# Altium footprint library Lib_001.PcbLib: 429 footprints (part 18 of 28)
Each footprint in its own frame and in the unit in brackets; x right, y up, seen from the top. Pads: shape width x height; smd on the part's side, far side on the other; paste and mask are expansions set on the pad; w line width, h text height; cw(c..) or ccw(c..) is an arc to the next point about the centre after c.
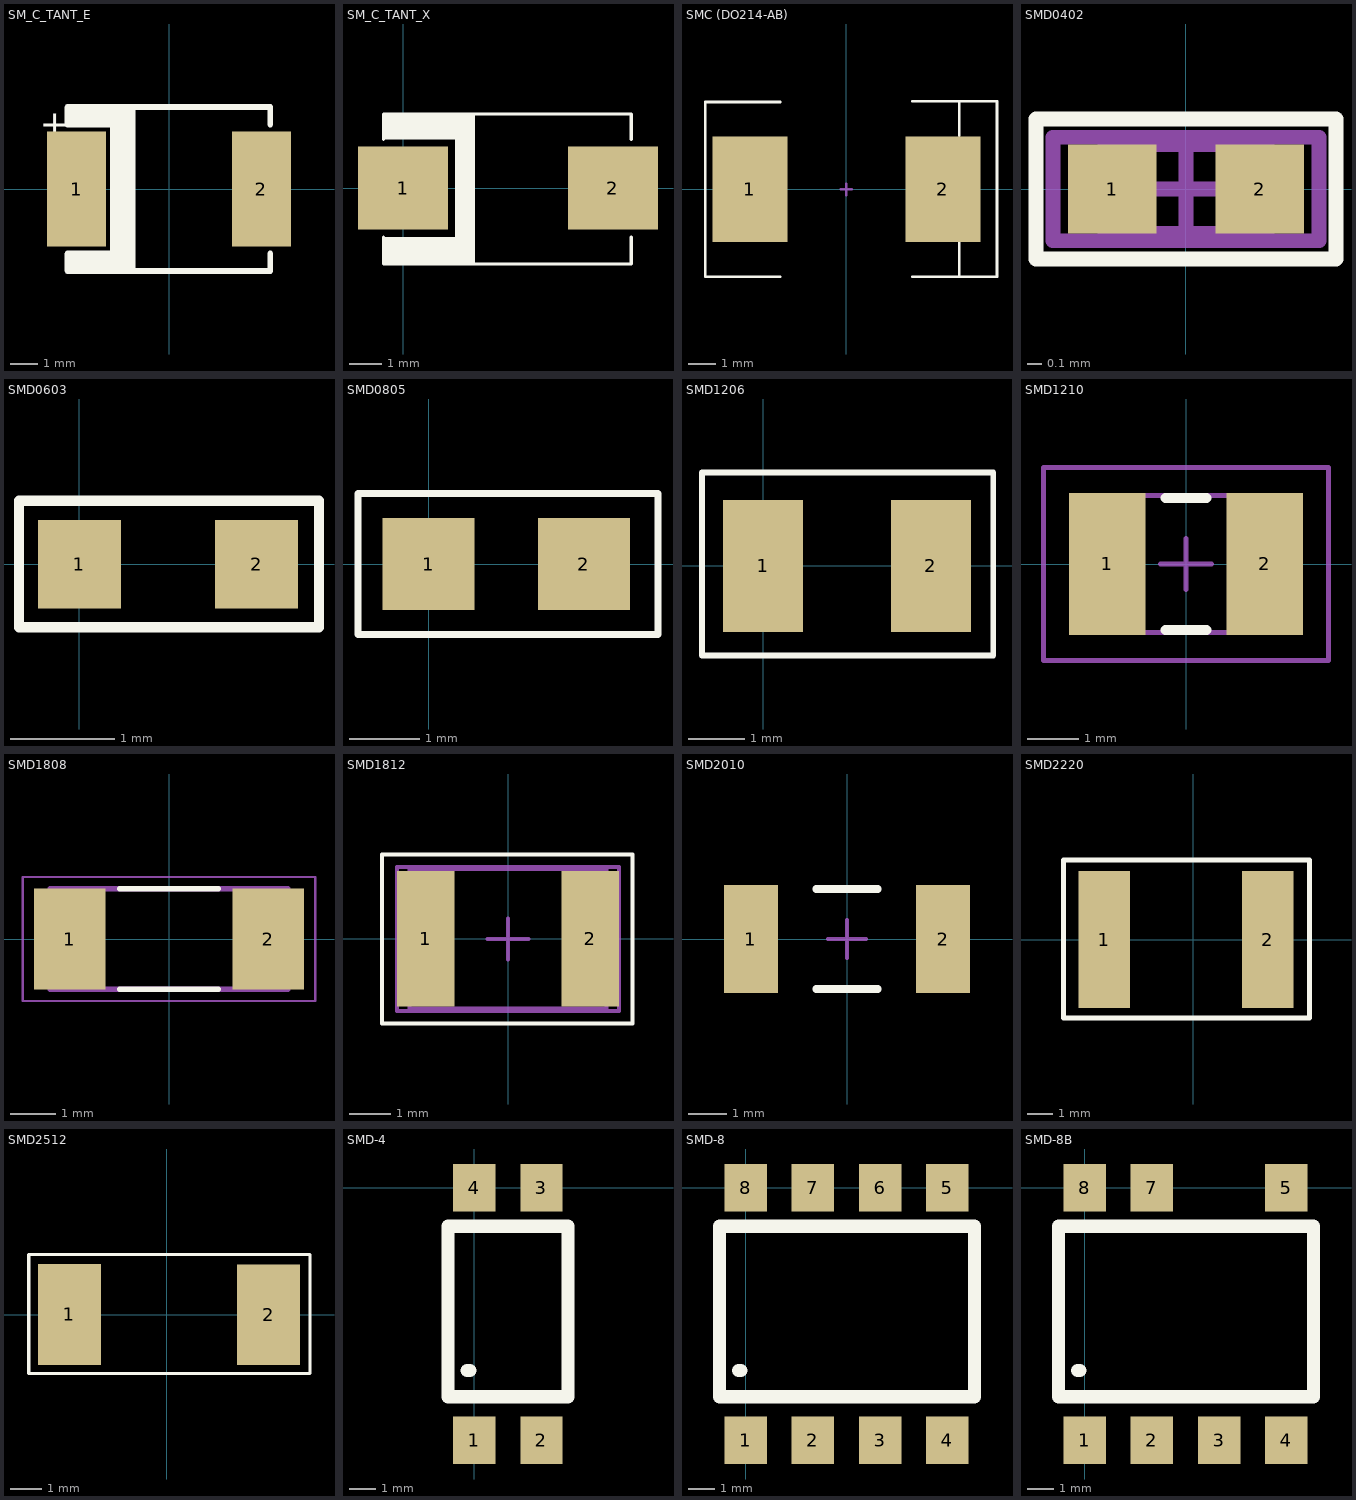
[diagram p17: the footprints below, top view; thin cyan lines are the x and y axes]

## SM_C_TANT_E [mil]
pads (2):
  rect 85x165 smd: 1(-132.5,0) 2(132.5,0)
Top Overlay:
  region: -49.44,120.56 -48.17,117.5 -48.17,-117.5 -49.44,-120.56 -52.5,-121.83 -145,-121.83 -148.06,-120.56 -149.33,-117.5 -149.33,-92.5 -148.06,-89.44 -145,-88.17 -84.33,-88.17 -84.33,88.17 -145,88.17 -148.06,89.44 -149.33,92.5 -149.33,117.5 -148.06,120.56 -145,121.83 -52.5,121.83
  lines w8: -145,-92.5 -145,-117.5 145,-117.5 145,-92.5 ; -145,92.5 -145,117.5 145,117.5 145,92.5
  text "+" at -185,75 h37.5
Mechanical 3:
  text "JK" at -172.5,-30 h37.5
3D body "User Library-CaseE_7260-38.step": height 141.73, standoff 0, extent -142.51,-118.89 144.89,117.33

## SM_C_TANT_X [mm]
pads (2):
  rect 2.77x2.55 smd: 1(0,0) 2(6.44,0)
Top Overlay:
  region: -0.584,2.275 2.2,2.275 2.2,-2.325 -0.584,-2.325 -0.584,-1.516 -0.6,-1.5 1.6,-1.5 1.6,1.5 -0.6,1.5 -0.6,2.259
  lines w0.1: -0.6,-2.325 -0.6,-1.5 ; -0.6,1.5 -0.6,2.275 ; -0.584,-2.325 7,-2.325 7,-1.5 ; -0.584,2.275 7,2.275 7,1.5
3D body "75439.stp": height 6.31, standoff 2.01, extent -0.584,-2.325 7.016,2.275

## SMC (DO214-AB) [mm] "DO-214-AB/SMC; 2 C-Bend Leads; Body 7.9 x 5.9 mm, inc. leads (LxW)"
height 2.65
pads (2):
  rect 2.7x3.8 smd: 1(-3.475,0) 2(3.475,0)
Top Overlay:
  lines w0.1: -2.375,-3.15 -5.075,-3.15 -5.075,3.15 -2.375,3.15 ; 2.375,-3.15 5.425,-3.15 5.425,3.175 2.375,3.175 ; 4.064,-3.15 4.064,-1.93 ; 4.064,1.93 4.064,3.15
Mechanical 1:
  lines w0.1: -0.2,0 0.2,0 ; 0,-0.2 0,0.2
3D body "User Library-DO-214AB(SMC).STEP": height 2.67, standoff 0.03, extent -4.064,-3.15 4.064,3.15

## SMD0402 [mm]
pads (2):
  rect 0.6x0.6 smd: 1(-0.5,0) 2(0.5,0)
Top Overlay:
  lines w0.1: -1.016,-0.474 -1.016,0.475 1.015,0.475 1.016,0.474 1.016,-0.475 -1.015,-0.475 -1.016,-0.474
Mechanical 13:
  lines w0.1: -0.55,-0.3 0.55,-0.3 0.55,0.3 -0.55,0.3 -0.55,-0.3
Mechanical 15:
  lines w0.1: -0.3,0 0.3,0 ; 0,-0.3 0,0.3 ; -0.9,-0.35 0.9,-0.35 0.9,0.35 -0.9,0.35 -0.9,-0.35
3D body "RESC1005.STEP": height 0.4, standoff 0, extent -0.508,-0.25 0.492,0.25

## SMD0603 [mm]
pads (2):
  rect 0.8x0.85 smd: 1(0,0) 2(1.702,0)
Top Overlay:
  lines w0.1: -0.58,-0.604 2.302,-0.604 2.302,0.61 -0.58,0.61 -0.58,-0.604
3D body: height 0.47, standoff 0, extent 1.401,-0.425 1.651,0.425
3D body: height 0.47, standoff 0, extent 0.051,-0.425 0.301,0.425
3D body: height 0.45, standoff 0, extent 0.301,-0.425 1.401,0.425

## SMD0805 [mm]
height 0.5
pads (2):
  rect 1.3x1.3 smd: 1(0,0) 2(2.2,0)
Top Overlay:
  lines w0.1: -1,-1 -1,1 3.25,1 3.25,-1 -1,-1
3D body: height 1, standoff 0, extent 2.1,-0.65 2.6,0.65
3D body: height 1, standoff 0, extent -0.35,-0.65 0.1,0.65
3D body: height 1, standoff 0, extent 0.1,-0.65 2.1,0.65

## SMD1206 [mil]
pads (2):
  rect 56x92 smd: 1(0,0) 2(117,0)
Top Overlay:
  lines w3.94: -42.5,-62.5 160.5,-62.5 160.5,-11 160.5,65 -42.5,65 -42.5,-62.5
3D body: height 59.06, standoff 0, extent -19.68,-45.28 0,45.28
3D body: height 59.06, standoff 0, extent 118.11,-45.28 137.8,45.28
3D body: height 59.06, standoff 0, extent 0,-45.28 118.11,45.28

## SMD1210 [mm] "Chip Capacitor, Body 3.2x2.5mm, IPC Low Density"
height 1.5
pads (2):
  rect 1.5x2.8 smd: 1(-1.55,0) 2(1.55,0)
Top Overlay:
  lines w0.2: -0.4,-1.3 0.4,-1.3 ; -0.4,1.3 0.4,1.3
Mechanical 13:
  lines w0.1: -1.7,-1.35 -1.7,1.35 1.7,1.35 1.7,-1.35 -1.7,-1.35
Mechanical 15:
  lines w0.1: -0.5,0 0.5,0 ; 0,-0.5 0,0.5 ; -2.8,-1.9 -2.8,1.9 2.8,1.9 2.8,-1.9 -2.8,-1.9
3D body "User Library-RESC3225X06N.step": height 0.55, standoff 0, extent -1.611,-1.261 1.589,1.239

## SMD1808 [mm]
pads (2):
  rect 1.56x2.22 smd: 1(-2.175,0) 2(2.175,0)
Top Overlay:
  lines w0.127: -1.08,-1.1 1.08,-1.1 ; -1.08,1.1 1.08,1.1
Mechanical 13:
  lines w0.127: -2.6,-1.1 2.6,-1.1 2.6,1.1 -2.6,1.1 -2.6,-1.1
Mechanical 15:
  lines w0.05: -3.203,-1.358 3.203,-1.358 3.203,1.358 -3.203,1.358 -3.203,-1.358
3D body "User Library-cap_1808.step": height 2, standoff 0, extent -2.341,-0.978 2.259,1.022

## SMD1812 [mm] "Chip Capacitor, Body 4.5x3.2mm, IPC High Density"
height 1.4
pads (2):
  rect 1.4x3.3 smd: 1(-2,0) 2(2,0)
Top Overlay:
  lines w0.1: -3.064,-2.055 -3.064,2.05 3.026,2.05 3.026,-2.055 -3.064,-2.055
Mechanical 13:
  lines w0.1: -2.4,-1.7 2.4,-1.7 2.4,1.7 -2.4,1.7 -2.4,-1.7
Mechanical 15:
  lines w0.1: -0.5,0 0.5,0 ; 0,-0.5 0,0.5 ; -2.7,-1.75 2.7,-1.75 2.7,1.75 -2.7,1.75 -2.7,-1.75
3D body "User Library-1812 SMD Resistor.step": height 1.6, standoff 0, extent -2.263,-1.599 2.237,1.601

## SMD2010 [mm] "Chip Capacitor, Body 4.5x3.2mm, IPC High Density"
height 1.4
pads (2):
  rect 1.4x2.8 smd: 1(-2.5,0) 2(2.5,0)
Top Overlay:
  lines w0.2: -0.8,-1.3 0.8,-1.3 ; -0.8,1.3 0.8,1.3
Mechanical 15:
  lines w0.1: -0.5,0 0.5,0 ; 0,-0.5 0,0.5
3D body "User Library-R2010-2.step": height 0.6, standoff 0, extent -2.5,-1.25 2.5,1.25

## SMD2220 [mm] "Chip Capacitor, Body 5.7x6.4mm, IPC High Density"
height 1.4
pads (2):
  rect 2x5.3 smd: 1(-3.45,0) 2(2.87,0)
Top Overlay:
  lines w0.2: -5.04,-3.03 -5.04,3.08 -1.57,3.08 1.23,3.08 4.5,3.08 4.5,-3.03 1.18,-3.03 -5.04,-3.03
3D body "User Library-SMD Ceramic Capacitors_2220 (5650)_JL.step": height 2, standoff 0, extent -3.151,-2.5 2.551,2.5

## SMD2512 [mm] "Chip Capacitor, Body 2.54x1.27mm, IPC High Density"
height 1.3
pads (2):
  rect 2x3.2 smd: 1(-3.09,0.01) 2(3.23,0)
Top Overlay:
  lines w0.1: -4.38,-1.86 -4.38,1.91 4.54,1.91 4.54,-1.86 -4.38,-1.86
3D body "User Library-res2512_body.STEP": height 0.62, standoff 0, extent -3.07,-1.6 3.25,1.6

## SMD-4 [mm] "SMD версия DIP4"
pads (4):
  rect 1.6x1.8 smd: 1(0,-9.53) 2(2.54,-9.53) 3(2.54,0) 4(0,0)
Top Overlay:
  lines w0.5: -0.27,-6.9 -0.17,-6.9 ; -0.99,-7.89 3.54,-7.89 3.54,-1.45 -0.99,-1.45 -0.99,-7.89
3D body "User Library-DIP4_opto_iso.step": height 3.95, standoff 0.05, extent -1.136,-9.775 3.696,0.255

## SMD-8 [mm] "SMD версия DIP8"
pads (8):
  rect 1.6x1.8 smd: 1(0,-9.53) 2(2.54,-9.53) 3(5.08,-9.53) 4(7.62,-9.53) 5(7.62,0) 6(5.08,0) 7(2.54,0) 8(0,0)
Top Overlay:
  lines w0.5: -0.27,-6.9 -0.17,-6.9 ; -0.99,-7.89 -0.99,-1.45 8.65,-1.45 8.65,-7.89 -0.99,-7.89

## SMD-8B [mm] "SMD версия DIP8"
pads (7):
  rect 1.6x1.8 smd: 1(0,-9.53) 2(2.54,-9.53) 3(5.08,-9.53) 4(7.62,-9.53) 5(7.62,0) 7(2.54,0) 8(0,0)
Top Overlay:
  lines w0.5: -0.27,-6.9 -0.17,-6.9 ; -0.99,-7.89 -0.99,-1.45 8.65,-1.45 8.65,-7.89 -0.99,-7.89
3D body "User Library-SMD-8B.step": height 4, standoff 0, extent -1.125,-9.67 8.725,0.13